# Altium footprint library Connectors Pad Lib.PcbLib: 211 footprints (part 13 of 14)
Each footprint in its own frame and in the unit in brackets; x right, y up, seen from the top. Pads: shape width x height; smd on the part's side, far side on the other; paste and mask are expansions set on the pad; w line width, h text height; cw(c..) or ccw(c..) is an arc to the next point about the centre after c.
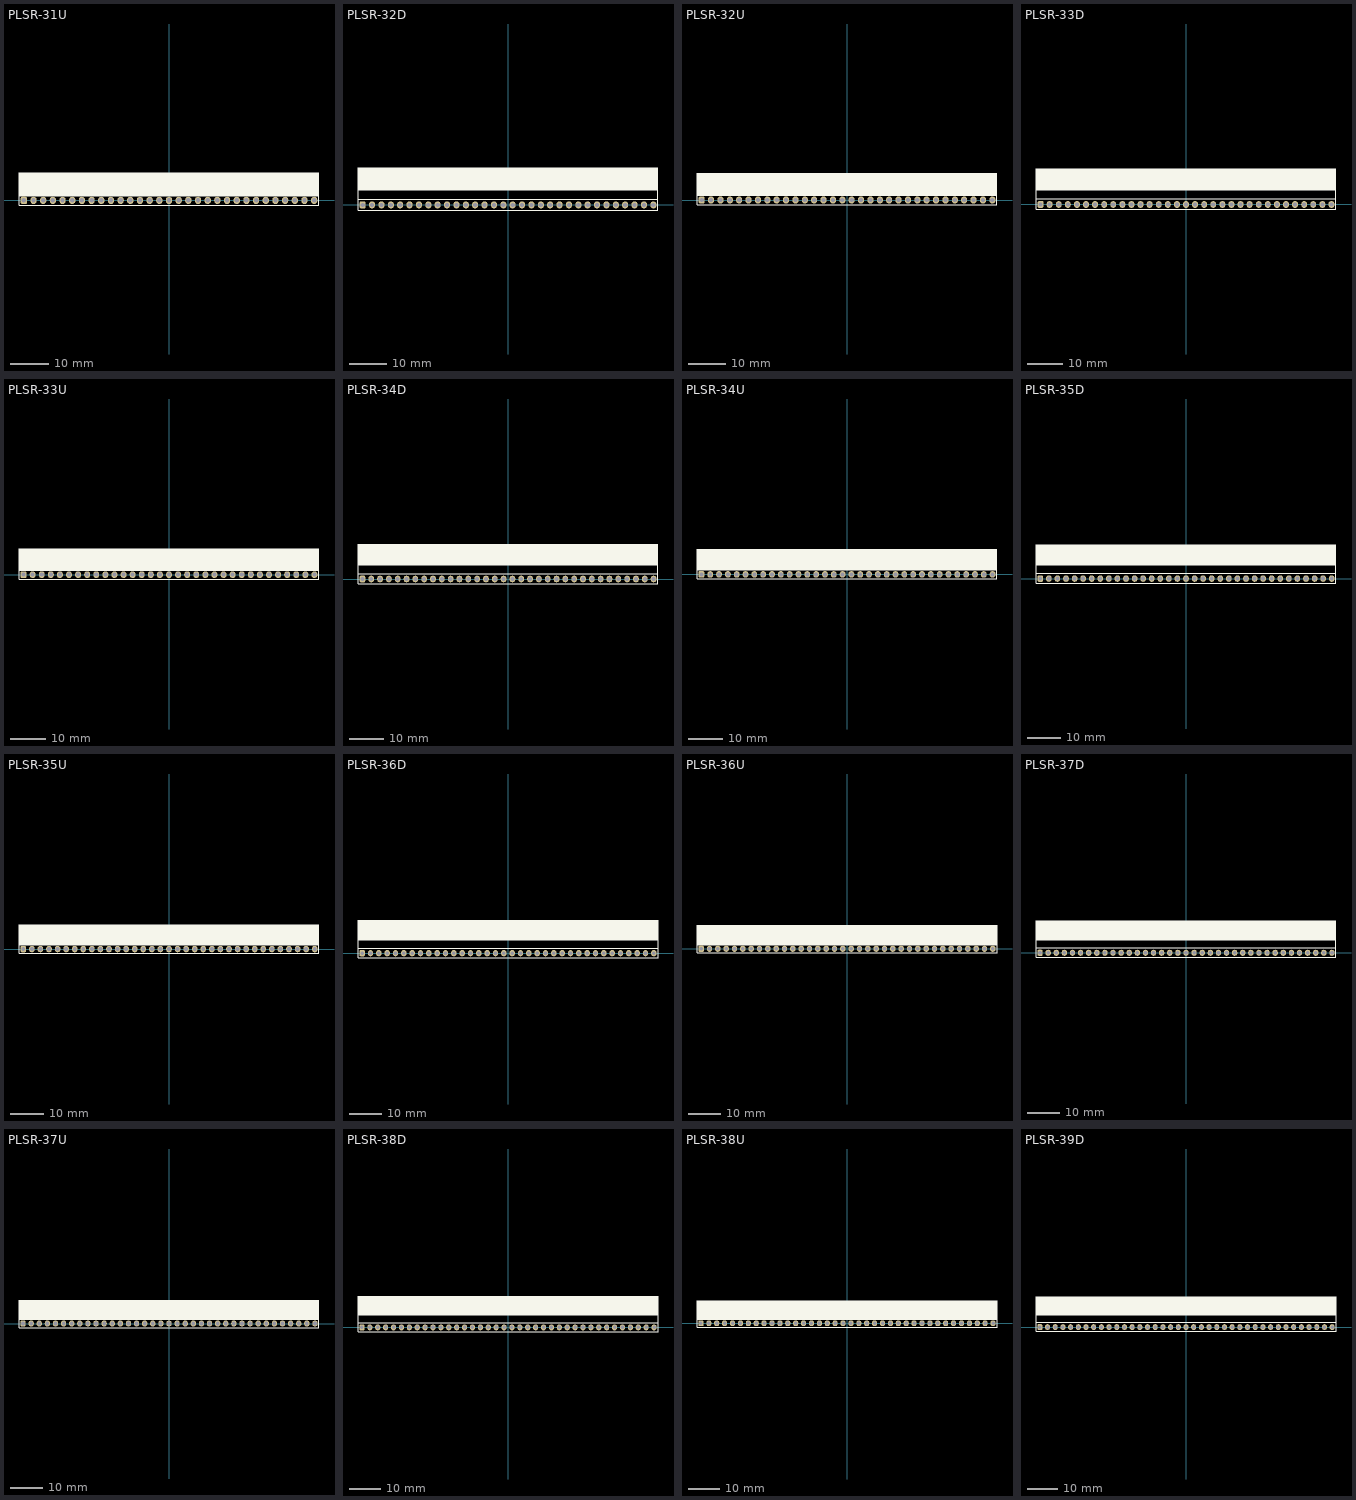
[diagram p12: the footprints below, top view; thin cyan lines are the x and y axes]

## PLSR-31U [mil] "PCB Right Angled Single Connector (U Type) 31-Pin"
height 236.3
pads (31):
  rrect50% 65x75 hole 45: 1(-1500,0)
  oval 65x75 hole 45: 2(-1400,0) 3(-1300,0) 4(-1200,0) 5(-1100,0) 6(-1000,0) 7(-900,0) 8(-800,0) 9(-700,0) 10(-600,0) 11(-500,0) 12(-400,0) 13(-300,0) 14(-200,0) 15(-100,0) 16(0,0) 17(100,0) 18(200,0) 19(300,0) 20(400,0) 21(500,0) 22(600,0) 23(700,0) 24(800,0) 25(900,0) 26(1000,0) 27(1100,0) 28(1200,0) 29(1300,0) 30(1400,0) 31(1500,0)
Top Overlay:
  rectangle: -1550,50 1550,285
  lines w10: -1550,50 1550,50 ; -1550,-50 -1550,285 1550,285 1550,-50 -1550,-50
3D body "PLSRU-31.STEP": height 239.98, standoff -117.11, extent -1550,-50 1550,286.22

## PLSR-32D [mil] "PCB Right Angled Single Connector (D Type) 32-Pin"
height 98.42
pads (32):
  rrect50% 65x75 hole 45: 1(-1550,0)
  oval 65x75 hole 45: 2(-1450,0) 3(-1350,0) 4(-1250,0) 5(-1150,0) 6(-1050,0) 7(-950,0) 8(-850,0) 9(-750,0) 10(-650,0) 11(-550,0) 12(-450,0) 13(-350,0) 14(-250,0) 15(-150,0) 16(-50,0) 17(50,0) 18(150,0) 19(250,0) 20(350,0) 21(450,0) 22(550,0) 23(650,0) 24(750,0) 25(850,0) 26(950,0) 27(1050,0) 28(1150,0) 29(1250,0) 30(1350,0) 31(1450,0) 32(1550,0)
Top Overlay:
  rectangle: -1600,160 1600,395
  lines w10: -1600,61 1600,61 ; -1600,161 1600,161 ; -1600,-55 -1600,395 1600,395 1600,-55 -1600,-55
3D body "PLSR-32D.STEP": height 101, standoff -117.11, extent -1600,-11.02 1600,396.85

## PLSR-32U [mil] "PCB Right Angled Single Connector (U Type) 32-Pin"
height 236.3
pads (32):
  rrect50% 65x75 hole 45: 1(-1550,0)
  oval 65x75 hole 45: 2(-1450,0) 3(-1350,0) 4(-1250,0) 5(-1150,0) 6(-1050,0) 7(-950,0) 8(-850,0) 9(-750,0) 10(-650,0) 11(-550,0) 12(-450,0) 13(-350,0) 14(-250,0) 15(-150,0) 16(-50,0) 17(50,0) 18(150,0) 19(250,0) 20(350,0) 21(450,0) 22(550,0) 23(650,0) 24(750,0) 25(850,0) 26(950,0) 27(1050,0) 28(1150,0) 29(1250,0) 30(1350,0) 31(1450,0) 32(1550,0)
Top Overlay:
  rectangle: -1600,50 1600,285
  lines w10: -1600,50 1600,50 ; -1600,-50 -1600,285 1600,285 1600,-50 -1600,-50
3D body "PLSRU-32.STEP": height 239.98, standoff -117.11, extent -1600,-50 1600,286.22

## PLSR-33D [mil] "PCB Right Angled Single Connector (D Type) 33-Pin"
height 98.42
pads (33):
  rrect50% 65x75 hole 45: 1(-1600,0)
  oval 65x75 hole 45: 2(-1500,0) 3(-1400,0) 4(-1300,0) 5(-1200,0) 6(-1100,0) 7(-1000,0) 8(-900,0) 9(-800,0) 10(-700,0) 11(-600,0) 12(-500,0) 13(-400,0) 14(-300,0) 15(-200,0) 16(-100,0) 17(0,0) 18(100,0) 19(200,0) 20(300,0) 21(400,0) 22(500,0) 23(600,0) 24(700,0) 25(800,0) 26(900,0) 27(1000,0) 28(1100,0) 29(1200,0) 30(1300,0) 31(1400,0) 32(1500,0) 33(1600,0)
Top Overlay:
  rectangle: -1650,160 1650,395
  lines w10: -1650,61 1650,61 ; -1650,161 1650,161 ; -1650,-55 1650,-55 1650,395 -1650,395 -1650,-55
3D body "PLSR-33D.STEP": height 101, standoff -117.11, extent -1650,-11.02 1650,396.85

## PLSR-33U [mil] "PCB Right Angled Single Connector (U Type) 33-Pin"
height 236.3
pads (33):
  rrect50% 65x75 hole 45: 1(-1600,0)
  oval 65x75 hole 45: 2(-1500,0) 3(-1400,0) 4(-1300,0) 5(-1200,0) 6(-1100,0) 7(-1000,0) 8(-900,0) 9(-800,0) 10(-700,0) 11(-600,0) 12(-500,0) 13(-400,0) 14(-300,0) 15(-200,0) 16(-100,0) 17(0,0) 18(100,0) 19(200,0) 20(300,0) 21(400,0) 22(500,0) 23(600,0) 24(700,0) 25(800,0) 26(900,0) 27(1000,0) 28(1100,0) 29(1200,0) 30(1300,0) 31(1400,0) 32(1500,0) 33(1600,0)
Top Overlay:
  rectangle: -1650,50 1650,285
  lines w10: -1650,50 1650,50 ; -1650,-50 1650,-50 1650,285 -1650,285 -1650,-50
3D body "PLSRU-33.STEP": height 239.98, standoff -117.11, extent -1650,-50 1650,286.22

## PLSR-34D [mil] "PCB Right Angled Single Connector (D Type) 34-Pin"
height 98.42
pads (34):
  rrect50% 65x75 hole 45: 1(-1650,0)
  oval 65x75 hole 45: 2(-1550,0) 3(-1450,0) 4(-1350,0) 5(-1250,0) 6(-1150,0) 7(-1050,0) 8(-950,0) 9(-850,0) 10(-750,0) 11(-650,0) 12(-550,0) 13(-450,0) 14(-350,0) 15(-250,0) 16(-150,0) 17(-50,0) 18(50,0) 19(150,0) 20(250,0) 21(350,0) 22(450,0) 23(550,0) 24(650,0) 25(750,0) 26(850,0) 27(950,0) 28(1050,0) 29(1150,0) 30(1250,0) 31(1350,0) 32(1450,0) 33(1550,0) 34(1650,0)
Top Overlay:
  rectangle: -1700,160 1700,395
  lines w10: -1700,61 1700,61 ; -1700,161 1700,161 ; -1700,-55 -1700,395 1700,395 1700,-55 -1700,-55
3D body "PLSR-34D.STEP": height 101, standoff -117.11, extent -1700,-11.02 1700,396.85

## PLSR-34U [mil] "PCB Right Angled Single Connector (U Type) 34-Pin"
height 236.3
pads (34):
  rrect50% 65x75 hole 45: 1(-1650,0)
  oval 65x75 hole 45: 2(-1550,0) 3(-1450,0) 4(-1350,0) 5(-1250,0) 6(-1150,0) 7(-1050,0) 8(-950,0) 9(-850,0) 10(-750,0) 11(-650,0) 12(-550,0) 13(-450,0) 14(-350,0) 15(-250,0) 16(-150,0) 17(-50,0) 18(50,0) 19(150,0) 20(250,0) 21(350,0) 22(450,0) 23(550,0) 24(650,0) 25(750,0) 26(850,0) 27(950,0) 28(1050,0) 29(1150,0) 30(1250,0) 31(1350,0) 32(1450,0) 33(1550,0) 34(1650,0)
Top Overlay:
  rectangle: -1700,50 1700,285
  lines w10: -1700,50 1700,50 ; -1700,-50 -1700,285 1700,285 1700,-50 -1700,-50
3D body "PLSRU-34.STEP": height 239.98, standoff -117.11, extent -1700,-50 1700,286.22

## PLSR-35D [mil] "PCB Right Angled Single Connector (D Type) 35-Pin"
height 98.42
pads (35):
  rrect50% 65x75 hole 45: 1(-1700,0)
  oval 65x75 hole 45: 2(-1600,0) 3(-1500,0) 4(-1400,0) 5(-1300,0) 6(-1200,0) 7(-1100,0) 8(-1000,0) 9(-900,0) 10(-800,0) 11(-700,0) 12(-600,0) 13(-500,0) 14(-400,0) 15(-300,0) 16(-200,0) 17(-100,0) 18(0,0) 19(100,0) 20(200,0) 21(300,0) 22(400,0) 23(500,0) 24(600,0) 25(700,0) 26(800,0) 27(900,0) 28(1000,0) 29(1100,0) 30(1200,0) 31(1300,0) 32(1400,0) 33(1500,0) 34(1600,0) 35(1700,0)
Top Overlay:
  rectangle: -1750,160 1750,395
  lines w10: -1750,61 1750,61 ; -1750,161 1750,161 ; -1750,-55 1750,-55 1750,395 -1750,395 -1750,-55
3D body "PLSR-35D.STEP": height 101, standoff -117.11, extent -1750,-11.02 1750,396.85

## PLSR-35U [mil] "PCB Right Angled Single Connector (U Type) 35-Pin"
height 236.3
pads (35):
  rrect50% 65x75 hole 45: 1(-1700,0)
  oval 65x75 hole 45: 2(-1600,0) 3(-1500,0) 4(-1400,0) 5(-1300,0) 6(-1200,0) 7(-1100,0) 8(-1000,0) 9(-900,0) 10(-800,0) 11(-700,0) 12(-600,0) 13(-500,0) 14(-400,0) 15(-300,0) 16(-200,0) 17(-100,0) 18(0,0) 19(100,0) 20(200,0) 21(300,0) 22(400,0) 23(500,0) 24(600,0) 25(700,0) 26(800,0) 27(900,0) 28(1000,0) 29(1100,0) 30(1200,0) 31(1300,0) 32(1400,0) 33(1500,0) 34(1600,0) 35(1700,0)
Top Overlay:
  rectangle: -1750,50 1750,285
  lines w10: -1750,50 1750,50 ; -1750,-50 1750,-50 1750,285 -1750,285 -1750,-50
3D body "PLSRU-35.STEP": height 239.98, standoff -117.11, extent -1750,-50 1750,286.22

## PLSR-36D [mil] "PCB Right Angled Single Connector (D Type) 36-Pin"
height 98.42
pads (36):
  rrect50% 65x75 hole 45: 1(-1750,0)
  oval 65x75 hole 45: 2(-1650,0) 3(-1550,0) 4(-1450,0) 5(-1350,0) 6(-1250,0) 7(-1150,0) 8(-1050,0) 9(-950,0) 10(-850,0) 11(-750,0) 12(-650,0) 13(-550,0) 14(-450,0) 15(-350,0) 16(-250,0) 17(-150,0) 18(-50,0) 19(50,0) 20(150,0) 21(250,0) 22(350,0) 23(450,0) 24(550,0) 25(650,0) 26(750,0) 27(850,0) 28(950,0) 29(1050,0) 30(1150,0) 31(1250,0) 32(1350,0) 33(1450,0) 34(1550,0) 35(1650,0) 36(1750,0)
Top Overlay:
  rectangle: -1800,160 1800,395
  lines w10: -1800,61 1800,61 ; -1800,161 1800,161 ; -1800,-55 1800,-55 1800,395 -1800,395 -1800,-55
3D body "PLSR-36D.STEP": height 101, standoff -117.11, extent -1800,-11.02 1800,396.85

## PLSR-36U [mil] "PCB Right Angled Single Connector (U Type) 36-Pin"
height 236.3
pads (36):
  rrect50% 65x75 hole 45: 1(-1750,0)
  oval 65x75 hole 45: 2(-1650,0) 3(-1550,0) 4(-1450,0) 5(-1350,0) 6(-1250,0) 7(-1150,0) 8(-1050,0) 9(-950,0) 10(-850,0) 11(-750,0) 12(-650,0) 13(-550,0) 14(-450,0) 15(-350,0) 16(-250,0) 17(-150,0) 18(-50,0) 19(50,0) 20(150,0) 21(250,0) 22(350,0) 23(450,0) 24(550,0) 25(650,0) 26(750,0) 27(850,0) 28(950,0) 29(1050,0) 30(1150,0) 31(1250,0) 32(1350,0) 33(1450,0) 34(1550,0) 35(1650,0) 36(1750,0)
Top Overlay:
  rectangle: -1800,50 1800,285
  lines w10: -1800,50 1800,50 ; -1800,-50 1800,-50 1800,285 -1800,285 -1800,-50
3D body "PLSRU-36.STEP": height 239.98, standoff -117.11, extent -1800,-50 1800,286.22

## PLSR-37D [mil] "PCB Right Angled Single Connector (D Type) 37-Pin"
height 98.42
pads (37):
  rrect50% 65x75 hole 45: 1(-1800,0)
  oval 65x75 hole 45: 2(-1700,0) 3(-1600,0) 4(-1500,0) 5(-1400,0) 6(-1300,0) 7(-1200,0) 8(-1100,0) 9(-1000,0) 10(-900,0) 11(-800,0) 12(-700,0) 13(-600,0) 14(-500,0) 15(-400,0) 16(-300,0) 17(-200,0) 18(-100,0) 19(0,0) 20(100,0) 21(200,0) 22(300,0) 23(400,0) 24(500,0) 25(600,0) 26(700,0) 27(800,0) 28(900,0) 29(1000,0) 30(1100,0) 31(1200,0) 32(1300,0) 33(1400,0) 34(1500,0) 35(1600,0) 36(1700,0) 37(1800,0)
Top Overlay:
  rectangle: -1850,160 1850,395
  lines w10: -1850,61 1850,61 ; -1850,161 1850,161 ; -1850,-55 -1850,395 1850,395 1850,-55 -1850,-55
3D body "PLSR-37D.STEP": height 101, standoff -117.11, extent -1850,-11.02 1850,396.85

## PLSR-37U [mil] "PCB Right Angled Single Connector (U Type) 37-Pin"
height 236.3
pads (37):
  rrect50% 65x75 hole 45: 1(-1800,0)
  oval 65x75 hole 45: 2(-1700,0) 3(-1600,0) 4(-1500,0) 5(-1400,0) 6(-1300,0) 7(-1200,0) 8(-1100,0) 9(-1000,0) 10(-900,0) 11(-800,0) 12(-700,0) 13(-600,0) 14(-500,0) 15(-400,0) 16(-300,0) 17(-200,0) 18(-100,0) 19(0,0) 20(100,0) 21(200,0) 22(300,0) 23(400,0) 24(500,0) 25(600,0) 26(700,0) 27(800,0) 28(900,0) 29(1000,0) 30(1100,0) 31(1200,0) 32(1300,0) 33(1400,0) 34(1500,0) 35(1600,0) 36(1700,0) 37(1800,0)
Top Overlay:
  rectangle: -1850,50 1850,285
  lines w10: -1850,50 1850,50 ; -1850,-50 -1850,285 1850,285 1850,-50 -1850,-50
3D body "PLSRU-37.STEP": height 239.98, standoff -117.11, extent -1850,-50 1850,286.22

## PLSR-38D [mil] "PCB Right Angled Single Connector (D Type) 38-Pin"
height 98.42
pads (38):
  rrect50% 65x75 hole 45: 1(-1850,0)
  oval 65x75 hole 45: 2(-1750,0) 3(-1650,0) 4(-1550,0) 5(-1450,0) 6(-1350,0) 7(-1250,0) 8(-1150,0) 9(-1050,0) 10(-950,0) 11(-850,0) 12(-750,0) 13(-650,0) 14(-550,0) 15(-450,0) 16(-350,0) 17(-250,0) 18(-150,0) 19(-50,0) 20(50,0) 21(150,0) 22(250,0) 23(350,0) 24(450,0) 25(550,0) 26(650,0) 27(750,0) 28(850,0) 29(950,0) 30(1050,0) 31(1150,0) 32(1250,0) 33(1350,0) 34(1450,0) 35(1550,0) 36(1650,0) 37(1750,0) 38(1850,0)
Top Overlay:
  rectangle: -1900,160 1900,395
  lines w10: -1900,61 1900,61 ; -1900,161 1900,161 ; -1900,-55 -1900,395 1900,395 1900,-55 -1900,-55
3D body "PLSR-38D.STEP": height 101, standoff -117.11, extent -1900,-11.02 1900,396.85

## PLSR-38U [mil] "PCB Right Angled Single Connector (U Type) 38-Pin"
height 236.3
pads (38):
  rrect50% 65x75 hole 45: 1(-1850,0)
  oval 65x75 hole 45: 2(-1750,0) 3(-1650,0) 4(-1550,0) 5(-1450,0) 6(-1350,0) 7(-1250,0) 8(-1150,0) 9(-1050,0) 10(-950,0) 11(-850,0) 12(-750,0) 13(-650,0) 14(-550,0) 15(-450,0) 16(-350,0) 17(-250,0) 18(-150,0) 19(-50,0) 20(50,0) 21(150,0) 22(250,0) 23(350,0) 24(450,0) 25(550,0) 26(650,0) 27(750,0) 28(850,0) 29(950,0) 30(1050,0) 31(1150,0) 32(1250,0) 33(1350,0) 34(1450,0) 35(1550,0) 36(1650,0) 37(1750,0) 38(1850,0)
Top Overlay:
  rectangle: -1900,50 1900,285
  lines w10: -1900,50 1900,50 ; -1900,-50 -1900,285 1900,285 1900,-50 -1900,-50
3D body "PLSRU-38.STEP": height 239.98, standoff -117.11, extent -1900,-50 1900,286.22

## PLSR-39D [mil] "PCB Right Angled Single Connector (D Type) 39-Pin"
height 98.42
pads (39):
  rrect50% 65x75 hole 45: 1(-1900,0)
  oval 65x75 hole 45: 2(-1800,0) 3(-1700,0) 4(-1600,0) 5(-1500,0) 6(-1400,0) 7(-1300,0) 8(-1200,0) 9(-1100,0) 10(-1000,0) 11(-900,0) 12(-800,0) 13(-700,0) 14(-600,0) 15(-500,0) 16(-400,0) 17(-300,0) 18(-200,0) 19(-100,0) 20(0,0) 21(100,0) 22(200,0) 23(300,0) 24(400,0) 25(500,0) 26(600,0) 27(700,0) 28(800,0) 29(900,0) 30(1000,0) 31(1100,0) 32(1200,0) 33(1300,0) 34(1400,0) 35(1500,0) 36(1600,0) 37(1700,0) 38(1800,0) 39(1900,0)
Top Overlay:
  rectangle: -1950,160 1950,395
  lines w10: -1950,61 1950,61 ; -1950,161 1950,161 ; -1950,-55 -1950,395 1950,395 1950,-55 -1950,-55
3D body "PLSR-39D.STEP": height 101, standoff -117.11, extent -1950,-11.02 1950,396.85